# Altium footprint library THT_Bauteile.PcbLib: 59 footprints (part 1 of 4)
Each footprint in its own frame and in the unit in brackets; x right, y up, seen from the top. Pads: shape width x height; smd on the part's side, far side on the other; paste and mask are expansions set on the pad; w line width, h text height; cw(c..) or ccw(c..) is an arc to the next point about the centre after c.
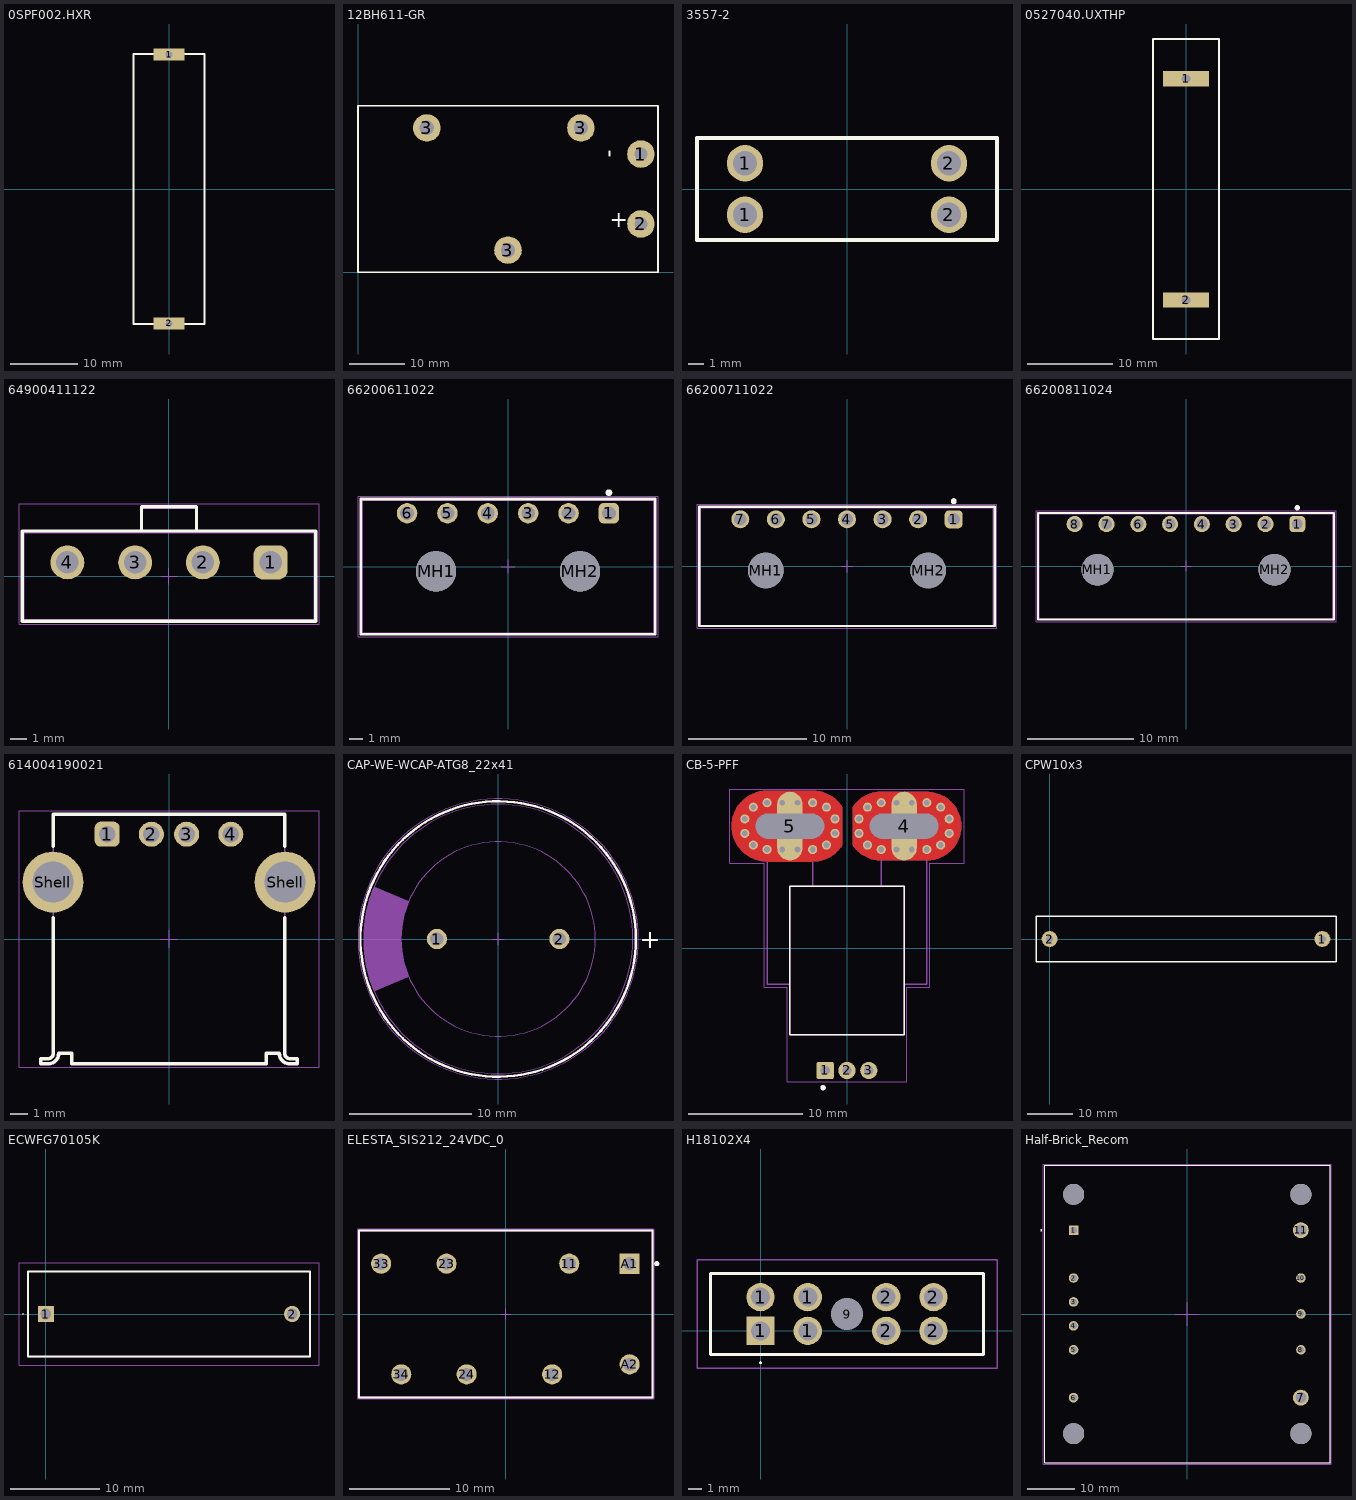
[diagram p0: the footprints below, top view; thin cyan lines are the x and y axes]

## 0SPF002.HXR [mm] "2A 1000V Fuse"
height 12.7
pads (2):
  rect 4.6x1.8 hole 1.02 square: 1(0,19.91) 2(0,-19.91)
Top Overlay:
  lines w0.254: -5.25,-20 -5.25,20 5.25,20 5.25,-20 -5.25,-20
3D body "Littelfuse-Midget-10x38-3D-Model.stp": height 12.16, standoff 1.84, extent -5.156,-19.027 5.156,19.084

## 12BH611-GR [mm] "9V Battery Holder"
pads (5):
  round 5 hole 2.4: 1(51.4,21.45) 2(51.4,8.75)
  round 5 hole 2.6: 3(12.5,26.2) 3(27.25,4) 3(40.5,26.2)
Top Overlay:
  lines w0.3: 0,0 54.5,0 54.5,30.2 0,30.2 0,0
  text "-" at 47.863,20.8 h5
  text "+" at 45.7,7.182 h5

## 3557-2 [mm]
pads (4):
  round 2.4 hole 1.6: 1(-6.735,-1.7) 1(-6.735,1.7) 2(6.735,-1.7) 2(6.735,1.7)
Top Overlay:
  lines w0.254: -9.905,-3.365 -9.905,3.365 9.905,3.365 9.905,-3.365 -9.905,-3.365
Mechanical 13:
  lines w0.254: -9.905,-3.365 9.905,-3.365 9.905,3.365 -9.905,3.365 -9.905,-3.365
3D body "3557-2.stp": height 7.42, standoff -2.74, extent -9.907,-3.365 9.905,3.366

## 0527040.UXTHP [mm] "40A 500V"
height 12.7
pads (2):
  rect 5.4x1.8 hole 1.02 square: 1(0,13.04) 2(0,-13.02)
Top Overlay:
  lines w0.254: -3.9,-17.6 -3.9,17.7 3.9,17.7 3.9,-17.6 -3.9,-17.6
3D body: height 4.5, standoff -4.5, extent -1.9,-13.295 1.9,-12.745
3D body: height 4.5, standoff -4.5, extent -1.9,12.765 1.9,13.315
3D body: height 5, standoff 0, extent -3,12.765 3,13.315
3D body: height 5, standoff 0, extent -3,-13.295 3,-12.745
3D body: height 10.5, standoff 3, extent -3.75,-17.625 3.75,17.625

## 64900411122 [mm] "4.20mm Male Single Row Vertical Header, 4p"
height 12.8
pads (4):
  rrect50% 2.1x2.1 hole 1.4: 1(6.3,0.85)
  round 2.1 hole 1.4: 2(2.1,0.85) 3(-2.1,0.85) 4(-6.3,0.85)
Top Overlay:
  lines w0.2: -1.7,2.8 -1.7,4.3 1.7,4.3 1.7,2.8 ; -9.1,-2.8 -9.1,2.8 9.1,2.8 9.1,-2.8 -9.1,-2.8
Top Courtyard:
  lines w0.05: -0.5,0 0.5,0 ; 0,-0.5 0,0.5 ; -9.3,-3 -9.3,4.5 9.3,4.5 9.3,-3 -9.3,-3
Top Component Outline:
  lines w0.1: -1.7,2.7 -1.7,4.2 1.7,4.2 1.7,2.7 ; -9,-2.7 9,-2.7 9,2.7 -9,2.7 -9,-2.7
Top Designator:
  text ".Designator" at -7.498,-0.5 h1.5
3D body "64900411122.stp": height 12.83, standoff -3.47, extent -9,-2.7 9,4.2

## 66200611022 [mm] "3.00mm Male Single Row Angled Header with Plastic Pegs, 6p"
height 5.07
pads (8):
  rrect50% 1.52x1.52 hole 1.02: 1(7.5,3.97)
  round 1.52 hole 1.02: 2(4.5,3.97) 3(1.5,3.97) 4(-1.5,3.97) 5(-4.5,3.97) 6(-7.5,3.97)
  round 3 hole 3 unplated: MH1(-5.35,-0.35) MH2(5.35,-0.35)
Top Overlay:
  circle w0.25: c7.5,5.5 r0.125
  lines w0.2: -10.95,-5.025 10.95,-5.025 10.95,5.025 -10.95,5.025 -10.95,-5.025
Top 3D Body:
  lines w0.1: -10.825,-4.95 -10.825,4.95 10.825,4.95 10.825,-4.95 -10.825,-4.95
Top Courtyard:
  lines w0.05: -11.15,-5.225 11.15,-5.225 11.15,5.225 -11.15,5.225 -11.15,-5.225
Top Component Center:
  lines w0.05: -0.5,0 0.5,0 ; 0,-0.5 0,0.5
Top Component Outline:
  lines w0.1: -10.825,-4.95 -10.825,4.95 10.825,4.95 10.825,-4.95 -10.825,-4.95
Top Designator:
  text ".Designator" at -7.498,-0.5 h1.5
3D body "66200611022.stp": height 5.6, standoff -3.16, extent -10.825,-4.95 10.825,4.95

## 66200711022 [mm] "3.00mm Male Single Row Angled Header with Plastic Pegs, 7p"
height 5.07
pads (9):
  rrect50% 1.52x1.52 hole 1.02: 1(9,3.97)
  round 1.52 hole 1.02: 2(6,3.97) 3(3,3.97) 4(0,3.97) 5(-3,3.97) 6(-6,3.97) 7(-9,3.97)
  round 3 hole 3 unplated: MH1(-6.85,-0.35) MH2(6.85,-0.35)
Top Overlay:
  circle w0.25: c9,5.5 r0.125
  lines w0.2: -12.45,-5.025 12.45,-5.025 12.45,5.025 -12.45,5.025 -12.45,-5.025
Top 3D Body:
  lines w0.1: -12.325,-4.95 -12.325,4.95 12.325,4.95 12.325,-4.95 -12.325,-4.95
Top Courtyard:
  lines w0.05: -12.65,-5.225 12.65,-5.225 12.65,5.225 -12.65,5.225 -12.65,-5.225
Top Component Center:
  lines w0.05: -0.5,0 0.5,0 ; 0,-0.5 0,0.5
Top Component Outline:
  lines w0.1: -12.325,-4.95 -12.325,4.95 12.325,4.95 12.325,-4.95 -12.325,-4.95
Top Designator:
  text ".Designator" at -7.498,-0.5 h1.5
3D body "66200711022.stp": height 5.6, standoff -3.16, extent -12.325,-4.95 12.325,4.95

## 66200811024 [mm] "3.00mm Male Single Row Angled Header with Plastic Pegs, 8p"
height 5.07
pads (10):
  rrect50% 1.52x1.52 hole 1.02: 1(10.5,3.97)
  round 1.52 hole 1.02: 2(7.5,3.97) 3(4.5,3.97) 4(1.5,3.97) 5(-1.5,3.97) 6(-4.5,3.97) 7(-7.5,3.97) 8(-10.5,3.97)
  round 3 hole 3 unplated: MH1(-8.35,-0.35) MH2(8.35,-0.35)
Top Overlay:
  circle w0.25: c10.5,5.5 r0.125
  lines w0.2: -13.95,-5.025 -13.95,5.025 13.95,5.025 13.95,-5.025 -13.95,-5.025
Top 3D Body:
  lines w0.1: -13.825,-4.95 13.825,-4.95 13.825,4.95 -13.825,4.95 -13.825,-4.95
Top Courtyard:
  lines w0.05: -14.15,-5.225 -14.15,5.225 14.15,5.225 14.15,-5.225 -14.15,-5.225
Top Component Center:
  lines w0.05: -0.5,0 0.5,0 ; 0,-0.5 0,0.5
Top Component Outline:
  lines w0.1: -13.825,-4.95 13.825,-4.95 13.825,4.95 -13.825,4.95 -13.825,-4.95
Top Designator:
  text ".Designator" at -7.498,-0.5 h1.5
3D body "66200811024.stp": height 5.6, standoff -3.16, extent -13.825,-4.95 13.825,4.95

## 614004190021 [mm] "USB 2.0 Type A Horizontal THT"
height 6.9
pads (6):
  rrect50% 1.42x1.42 hole 0.92: 1(-3.5,5.935)
  round 1.42 hole 0.92: 2(-1,5.935) 3(1,5.935) 4(3.5,5.935)
  round 3.45 hole 2.3: Shell(-6.57,3.225) Shell(6.57,3.225)
Top Overlay:
  lines w0.2: -6.55,1.2 -6.55,-6.475 cw(c-6.85,-6.475) -6.85,-6.775 -7.25,-6.775 -7.25,-7.075 -6.85,-7.075 ccw(c-6.85,-6.475) -6.25,-6.475 -5.5,-6.475 -5.5,-7.075 5.5,-7.075 5.5,-6.475 6.25,-6.475 ccw(c6.85,-6.475) 6.85,-7.075 7.25,-7.075 7.25,-6.775 6.85,-6.775 cw(c6.85,-6.475) 6.55,-6.475 6.55,1.2 ; -6.55,5.25 -6.55,7.075 6.55,7.075 6.55,5.25
Top 3D Body:
  lines w0.1: -7.25,-7.075 -7.25,-6.775 -6.85,-6.775 ccw(c-6.85,-6.475) -6.55,-6.475 -6.55,7.075 6.55,7.075 6.55,-6.475 ccw(c6.85,-6.475) 6.85,-6.775 7.25,-6.775 7.25,-7.075 6.85,-7.075 cw(c6.85,-6.475) 6.25,-6.475 5.5,-6.475 5.5,-7.075 -5.5,-7.075 -5.5,-6.475 -6.25,-6.475 cw(c-6.85,-6.475) -6.85,-7.075 -7.25,-7.075
Top Courtyard:
  lines w0.05: -0.5,0 0.5,0 ; 0,-0.5 0,0.5 ; -8.495,-7.275 -8.495,7.275 8.495,7.275 8.495,-7.275 -8.495,-7.275
Top Component Outline:
  lines w0.1: -7.25,-7.075 -6.85,-7.075 ccw(c-6.85,-6.475) -6.25,-6.475 -5.5,-6.475 -5.5,-7.075 5.5,-7.075 5.5,-6.475 6.25,-6.475 ccw(c6.85,-6.475) 6.85,-7.075 7.25,-7.075 7.25,-6.775 6.85,-6.775 cw(c6.85,-6.475) 6.55,-6.475 6.55,7.075 -6.55,7.075 -6.55,-6.475 cw(c-6.85,-6.475) -6.85,-6.775 -7.25,-6.775 -7.25,-7.075
Top Designator:
  text ".Designator" at -7.498,-0.5 h1.5
3D body "614004190021.stp": height 7.8, standoff -3.6, extent -7.85,-7.075 7.85,7.075

## CAP-WE-WCAP-ATG8_22x41 [mm] "Aluminum Electrolytic Capacitors, 22x41mm"
height 43
pads (2):
  round 1.65 hole 1.1: 1(-5,0) 2(5,0)
Top Overlay:
  circle w0.2: c0,0 r11.25
  text "+" at 11.55,-0.75 h1.5
Mechanical 13:
  circle w0.1: c0,0 r11
  circle w0.1: c0,0 r7.94
  region: -10.135,-4.275 -7.31,-3.099 -7.312,-3.094 -7.458,-2.725 -7.693,-1.966 -7.851,-1.187 -7.93,-0.397 -7.93,0.397 -7.851,1.187 -7.693,1.966 -7.458,2.725 -7.312,3.094 -7.31,3.099 -10.135,4.275 -10.277,3.938 -10.517,3.246 -10.709,2.54 -10.854,1.822 -10.951,1.097 -11,0.366 -11,-0.366 -10.951,-1.097 -10.854,-1.822 -10.709,-2.54 -10.517,-3.246 -10.277,-3.938
Mechanical 15:
  circle w0.05: c0,0 r11.45
  lines w0.05: -0.5,0 0.5,0 ; 0,-0.5 0,0.5
3D body "22x41x10x0.8.stp": height 41.31, standoff -19.91, extent -10.99,-11 11,10.996

## CB-5-PFF [mm] "Package CB, 5-Pin, Leadform PFF, Allegro MicroSystems"
height 7
pads (37):
  rrect20% 1.5x1.5 hole 0.8: 1(-1.91,-10.7)
  round 1.5 hole 0.8: 2(0,-10.7) 3(1.91,-10.7)
  oval 2.225x6.025 hole 2.2 slot 6 at 0 deg mask+0: 4(5,10.7) 5(-5,10.7)
  round 0.8 hole 0.5: 4_1(3,8.65) 4_2(4.33,8.65) 4_3(5.66,8.65) 4_4(6.99,8.65) 4_5(8.205,9.042) 4_6(8.95,10.067) 4_7(8.95,11.333) 4_8(8.205,12.358) 4_9(6.99,12.75) 4_10(5.66,12.75) 4_11(4.33,12.75) 4_12(3,12.75) 4_13(1.795,12.358) 4_14(1.05,11.333) 4_15(1.05,10.067) 4_16(1.795,9.042) 5_1(-7,8.65) 5_2(-5.67,8.65) 5_3(-4.34,8.65) 5_4(-3.01,8.65) 5_5(-8.205,9.042) 5_6(-8.95,11.333) 5_7(-8.95,10.067) 5_8(-8.205,12.358) 5_9(-7,12.75) 5_10(-5.67,12.75) 5_11(-4.34,12.75) 5_12(-3.01,12.75) 5_13(-1.795,12.358) 5_14(-1.05,11.333) 5_15(-1.05,10.067) 5_16(-1.795,9.042)
Top Layer:
  region: 0.5,9.04 0.56,8.95 0.618,8.87 0.679,8.792 0.742,8.716 0.808,8.642 0.876,8.571 0.946,8.502 1.019,8.435 1.094,8.371 1.171,8.309 1.25,8.25 1.331,8.194 1.414,8.141 1.499,8.09 1.585,8.042 1.673,7.997 1.763,7.955 1.853,7.917 1.945,7.881 2.039,7.848 2.133,7.819 2.228,7.792 2.324,7.769 2.421,7.75 2.518,7.733 2.616,7.72 2.714,7.71 2.812,7.703 2.911,7.7 3,7.7 7,7.7 7.157,7.704 7.314,7.716 7.469,7.737 7.624,7.766 7.776,7.802 7.927,7.847 8.075,7.899 8.22,7.959 8.362,8.027 8.5,8.102 8.634,8.184 8.763,8.273 8.888,8.369 9.007,8.471 9.121,8.579 9.229,8.693 9.331,8.812 9.427,8.937 9.516,9.066 9.598,9.2 9.673,9.338 9.741,9.48 9.801,9.625 9.853,9.773 9.898,9.924 9.934,10.076 9.963,10.231 9.984,10.386 9.996,10.543 10,10.7 9.996,10.857 9.984,11.014 9.963,11.169 9.934,11.324 9.898,11.476 9.853,11.627 9.801,11.775 9.741,11.92 9.673,12.062 9.598,12.2 9.516,12.334 9.427,12.463 9.331,12.588 9.229,12.707 9.121,12.821 9.007,12.929 8.888,13.031 8.763,13.127 8.634,13.216 8.5,13.298 8.362,13.373 8.22,13.441 8.075,13.501 7.927,13.553 7.776,13.598 7.624,13.634 7.469,13.663 7.314,13.684 7.157,13.696 7,13.7 3,13.7 2.911,13.7 2.812,13.697 2.714,13.69 2.616,13.68 2.518,13.667 2.421,13.65 2.324,13.631 2.228,13.608 2.133,13.581 2.039,13.552 1.945,13.519 1.853,13.483 1.763,13.445 1.673,13.403 1.585,13.358 1.499,13.31 1.414,13.259 1.331,13.206 1.25,13.15 1.171,13.091 1.094,13.029 1.019,12.965 0.946,12.898 0.876,12.829 0.808,12.758 0.742,12.684 0.679,12.608 0.618,12.53 0.56,12.45 0.5,12.36 0.5,10.7
  region: -10.1,10.7 -10.096,10.538 -10.083,10.376 -10.062,10.215 -10.032,10.055 -9.994,9.898 -9.948,9.742 -9.894,9.589 -9.832,9.439 -9.762,9.293 -9.685,9.15 -9.6,9.012 -9.508,8.878 -9.409,8.749 -9.304,8.626 -9.192,8.508 -9.074,8.396 -8.951,8.291 -8.822,8.192 -8.688,8.1 -8.55,8.015 -8.407,7.938 -8.261,7.868 -8.111,7.806 -7.958,7.752 -7.802,7.706 -7.645,7.668 -7.485,7.638 -7.324,7.617 -7.162,7.604 -7,7.6 -3,7.6 -2.896,7.602 -2.792,7.607 -2.689,7.616 -2.586,7.628 -2.484,7.644 -2.383,7.663 -2.282,7.685 -2.181,7.711 -2.082,7.74 -1.984,7.773 -1.887,7.809 -1.791,7.848 -1.697,7.89 -1.604,7.936 -1.513,7.984 -1.423,8.036 -1.335,8.091 -1.25,8.148 -1.166,8.209 -1.084,8.272 -1.004,8.338 -0.927,8.407 -0.852,8.478 -0.779,8.551 -0.709,8.627 -0.642,8.706 -0.577,8.787 -0.515,8.869 -0.456,8.954 -0.4,9.04 -0.4,12.36 -0.456,12.446 -0.515,12.531 -0.577,12.613 -0.642,12.694 -0.709,12.773 -0.779,12.849 -0.852,12.922 -0.927,12.993 -1.004,13.062 -1.084,13.128 -1.166,13.191 -1.25,13.252 -1.335,13.309 -1.423,13.364 -1.513,13.416 -1.604,13.464 -1.697,13.51 -1.791,13.552 -1.887,13.591 -1.984,13.627 -2.082,13.66 -2.181,13.689 -2.282,13.715 -2.383,13.737 -2.484,13.756 -2.586,13.772 -2.689,13.784 -2.792,13.793 -2.896,13.798 -3,13.8 -7,13.8 -7.162,13.796 -7.324,13.783 -7.485,13.762 -7.645,13.732 -7.802,13.694 -7.958,13.648 -8.111,13.594 -8.261,13.532 -8.407,13.462 -8.55,13.385 -8.688,13.3 -8.822,13.208 -8.951,13.109 -9.074,13.004 -9.192,12.892 -9.304,12.774 -9.409,12.651 -9.508,12.522 -9.6,12.388 -9.685,12.25 -9.762,12.107 -9.832,11.961 -9.894,11.811 -9.948,11.658 -9.994,11.502 -10.032,11.345 -10.062,11.185 -10.083,11.024 -10.096,10.862
Bottom Layer:
  region: 0.5,9.04 0.56,8.95 0.618,8.87 0.679,8.792 0.742,8.716 0.808,8.642 0.876,8.571 0.946,8.502 1.019,8.435 1.094,8.371 1.171,8.309 1.25,8.25 1.331,8.194 1.414,8.141 1.499,8.09 1.585,8.042 1.673,7.997 1.763,7.955 1.853,7.917 1.945,7.881 2.039,7.848 2.133,7.819 2.228,7.792 2.324,7.769 2.421,7.75 2.518,7.733 2.616,7.72 2.714,7.71 2.812,7.703 2.911,7.7 3,7.7 7,7.7 7.157,7.704 7.314,7.716 7.469,7.737 7.624,7.766 7.776,7.802 7.927,7.847 8.075,7.899 8.22,7.959 8.362,8.027 8.5,8.102 8.634,8.184 8.763,8.273 8.888,8.369 9.007,8.471 9.121,8.579 9.229,8.693 9.331,8.812 9.427,8.937 9.516,9.066 9.598,9.2 9.673,9.338 9.741,9.48 9.801,9.625 9.853,9.773 9.898,9.924 9.934,10.076 9.963,10.231 9.984,10.386 9.996,10.543 10,10.7 9.996,10.857 9.984,11.014 9.963,11.169 9.934,11.324 9.898,11.476 9.853,11.627 9.801,11.775 9.741,11.92 9.673,12.062 9.598,12.2 9.516,12.334 9.427,12.463 9.331,12.588 9.229,12.707 9.121,12.821 9.007,12.929 8.888,13.031 8.763,13.127 8.634,13.216 8.5,13.298 8.362,13.373 8.22,13.441 8.075,13.501 7.927,13.553 7.776,13.598 7.624,13.634 7.469,13.663 7.314,13.684 7.157,13.696 7,13.7 3,13.7 2.911,13.7 2.812,13.697 2.714,13.69 2.616,13.68 2.518,13.667 2.421,13.65 2.324,13.631 2.228,13.608 2.133,13.581 2.039,13.552 1.945,13.519 1.853,13.483 1.763,13.445 1.673,13.403 1.585,13.358 1.499,13.31 1.414,13.259 1.331,13.206 1.25,13.15 1.171,13.091 1.094,13.029 1.019,12.965 0.946,12.898 0.876,12.829 0.808,12.758 0.742,12.684 0.679,12.608 0.618,12.53 0.56,12.45 0.5,12.36 0.5,10.7
  region: -10.1,10.7 -10.096,10.538 -10.083,10.376 -10.062,10.215 -10.032,10.055 -9.994,9.898 -9.948,9.742 -9.894,9.589 -9.832,9.439 -9.762,9.293 -9.685,9.15 -9.6,9.012 -9.508,8.878 -9.409,8.749 -9.304,8.626 -9.192,8.508 -9.074,8.396 -8.951,8.291 -8.822,8.192 -8.688,8.1 -8.55,8.015 -8.407,7.938 -8.261,7.868 -8.111,7.806 -7.958,7.752 -7.802,7.706 -7.645,7.668 -7.485,7.638 -7.324,7.617 -7.162,7.604 -7,7.6 -3,7.6 -2.896,7.602 -2.792,7.607 -2.689,7.616 -2.586,7.628 -2.484,7.644 -2.383,7.663 -2.282,7.685 -2.181,7.711 -2.082,7.74 -1.984,7.773 -1.887,7.809 -1.791,7.848 -1.697,7.89 -1.604,7.936 -1.513,7.984 -1.423,8.036 -1.335,8.091 -1.25,8.148 -1.166,8.209 -1.084,8.272 -1.004,8.338 -0.927,8.407 -0.852,8.478 -0.779,8.551 -0.709,8.627 -0.642,8.706 -0.577,8.787 -0.515,8.869 -0.456,8.954 -0.4,9.04 -0.4,12.36 -0.456,12.446 -0.515,12.531 -0.577,12.613 -0.642,12.694 -0.709,12.773 -0.779,12.849 -0.852,12.922 -0.927,12.993 -1.004,13.062 -1.084,13.128 -1.166,13.191 -1.25,13.252 -1.335,13.309 -1.423,13.364 -1.513,13.416 -1.604,13.464 -1.697,13.51 -1.791,13.552 -1.887,13.591 -1.984,13.627 -2.082,13.66 -2.181,13.689 -2.282,13.715 -2.383,13.737 -2.484,13.756 -2.586,13.772 -2.689,13.784 -2.792,13.793 -2.896,13.798 -3,13.8 -7,13.8 -7.162,13.796 -7.324,13.783 -7.485,13.762 -7.645,13.732 -7.802,13.694 -7.958,13.648 -8.111,13.594 -8.261,13.532 -8.407,13.462 -8.55,13.385 -8.688,13.3 -8.822,13.208 -8.951,13.109 -9.074,13.004 -9.192,12.892 -9.304,12.774 -9.409,12.651 -9.508,12.522 -9.6,12.388 -9.685,12.25 -9.762,12.107 -9.832,11.961 -9.894,11.811 -9.948,11.658 -9.994,11.502 -10.032,11.345 -10.062,11.185 -10.083,11.024 -10.096,10.862
Top Overlay:
  circle w0.24: c-2.1,-12.2 r0.12
  lines w0.127: -5,-7.55 -5,5.45 5,5.45 5,-7.55 -5,-7.55
Top Courtyard:
  lines w0.05: -10.25,7.45 -7.25,7.45 -7.25,-3.4 -5.25,-3.4 -5.25,-11.7 5.25,-11.7 5.25,-3.4 7.25,-3.4 7.25,7.45 10.25,7.45 10.25,13.95 -10.25,13.95 -10.25,7.45
Top Component Outline:
  lines w0: -5,11.7 -4.95,11.7 ; 5,11.7 5.05,11.7 ; -7,9.7 cw(c-7,10.7) -7,11.7 -3,11.7 cw(c-3,10.7) -3,9.7 -7,9.7 ; 3,9.7 cw(c3,10.7) 3,11.7 7,11.7 cw(c7,10.7) 7,9.7 3,9.7
  lines w0.127: -3,5.5 -3,10.7 -7,10.7 -7,-3.15 -5,-3.15 ; 3,5.5 3,10.7 7,10.7 7,-3.15 5,-3.15 ; -5,-3.15 -5,5.45 5,5.45 5,-7.55 -5,-7.55 -5,-3.15
3D body "ACS772LCB-100U-PFF-T.STEP": height 7.1, standoff -3.5, extent -7.269,-11.166 6.731,11.42

## CPW10x3 [mm] "Footprint für Body-Protection Widerstände"
pads (2):
  round 3.5 hole 1.5: 1(60,0) 2(0,0)
Top Overlay:
  lines w0.3: -3,-5 -3,5 63,5 63,-5 -3,-5

## ECWFG70105K [mm]
pads (2):
  rect 1.8x1.8 hole 1.2: 1(0,0)
  round 1.8 hole 1.2: 2(27.5,0)
Top Overlay:
  lines w0.1: -2.6,0 ccw(c-2.55,0) -2.5,0 ccw(c-2.55,0) -2.6,0
  lines w0.2: -2,-4.75 29.5,-4.75 29.5,4.75 -2,4.75 -2,-4.75
Mechanical 13:
  lines w0.1: -2,-4.75 29.5,-4.75 29.5,4.75 -2,4.75 -2,-4.75
Mechanical 15:
  lines w0.1: -3,-5.75 30.5,-5.75 30.5,5.75 -3,5.75 -3,-5.75
3D body "ECW-FG70105K.stp": height 18.6, standoff -5, extent -2,-4.75 29.5,4.75

## ELESTA_SIS212_24VDC_0 [mm]
pads (8):
  round 2 hole 1.3 paste-2539.97 mask+0: 11(6.3,5) 12(4.6,-6) 23(-5.9,5) 24(-3.9,-6) 33(-12.4,5) 34(-10.4,-6) A2(12.3,-5)
  rect 2x2 hole 1.3 paste-2539.97 mask+0: A1(12.3,5)
Top Overlay:
  circle w0.25: c15,5 r0.125
  lines w0.2: -14.6,-8.3 -14.6,8.3 14.6,8.3 14.6,-8.3 -14.6,-8.3
Mechanical 10:
  lines w0.2: -14.7,-8.4 -14.7,8.4 14.7,8.4 14.7,-8.4 -14.7,-8.4
  text ".Designator" at 0,0 h1
Mechanical 12:
  lines w0.15: -14.6,-8.3 -14.6,8.3 14.6,8.3 14.6,-8.3 -14.6,-8.3
Mechanical 15:
  lines w0.1: -0.5,0 0.5,0 ; 0,-0.5 0,0.5
  lines w0.2: -14.7,-8.4 -14.7,8.4 14.7,8.4 14.7,-8.4 -14.7,-8.4
3D body "Relay_ELESTA_SIS212_24VDC_eec.STEP": height 0.25, standoff 0, extent -14.7,-8.4 14.7,8.4

## H18102X4 [mm]
pads (9):
  rect 2.1x2.1 hole 1.4: 1(0,0)
  round 2.1 hole 1.4: 1(0,2.5) 1(3.5,0) 1(3.5,2.5) 2(9.3,0) 2(9.3,2.5) 2(12.8,0) 2(12.8,2.5)
  round 1.2 hole 2.4 unplated: 9(6.4,1.25)
Top Overlay:
  lines w0.1: 0,-2.4 cw(c0,-2.35) 0,-2.3 cw(c0,-2.35) 0,-2.4
  lines w0.2: -3.7,-1.75 -3.7,4.25 16.5,4.25 16.5,-1.75 -3.7,-1.75
Mechanical 13:
  lines w0.1: -3.7,-1.75 -3.7,4.25 16.5,4.25 16.5,-1.75 -3.7,-1.75
Mechanical 15:
  lines w0.1: -4.7,-2.75 -4.7,5.25 17.5,5.25 17.5,-2.75 -4.7,-2.75
3D body "H1810-2X4.stp": height 17.9, standoff -5, extent -3.7,-1.75 16.5,4.25

## Half-Brick_Recom [mm]
height 13
pads (15):
  rect 2.025x2.025 hole 1.35: 1(-24.16,17.8)
  round 2.025 hole 1.35: 2(-24.16,7.64) 3(-24.16,2.56) 4(-24.16,-2.52) 5(-24.16,-7.6) 6(-24.16,-17.76) 8(24.1,-7.6) 9(24.1,0.02) 10(24.1,7.64)
  round 3.366 hole 2.35: 7(24.1,-17.76) 11(24.1,17.8)
  round 4.5 hole 4.5 unplated: ""(-24.16,-25.4) ""(-24.16,25.4) ""(24.1,-25.4) ""(24.1,25.4)
Top Overlay:
  circle w0.2: c-31.03,17.8 r0.1
  lines w0.127: -30.3,-31.6 -30.3,31.6 30.3,31.6 30.3,-31.6 -30.3,-31.6
Top Courtyard:
  lines w0.05: -30.55,-31.85 -30.55,31.85 30.55,31.85 30.55,-31.85 -30.55,-31.85
Top Component Center:
  lines w0.127: -2.54,0 2.54,0 ; 0,-2.54 0,2.54
Top Component Outline:
  lines w0.127: -30.3,-31.6 -30.3,31.6 30.3,31.6 30.3,-31.6 -30.3,-31.6
3D body "RBBA3000-50.step": height 12.2, standoff -4.85, extent -30.3,-31.6 30.3,31.6